# Altium footprint library PCB1.PcbLib: 98 footprints (part 1 of 7)
Each footprint in its own frame and in the unit in brackets; x right, y up, seen from the top. Pads: shape width x height; smd on the part's side, far side on the other; paste and mask are expansions set on the pad; w line width, h text height; cw(c..) or ccw(c..) is an arc to the next point about the centre after c.
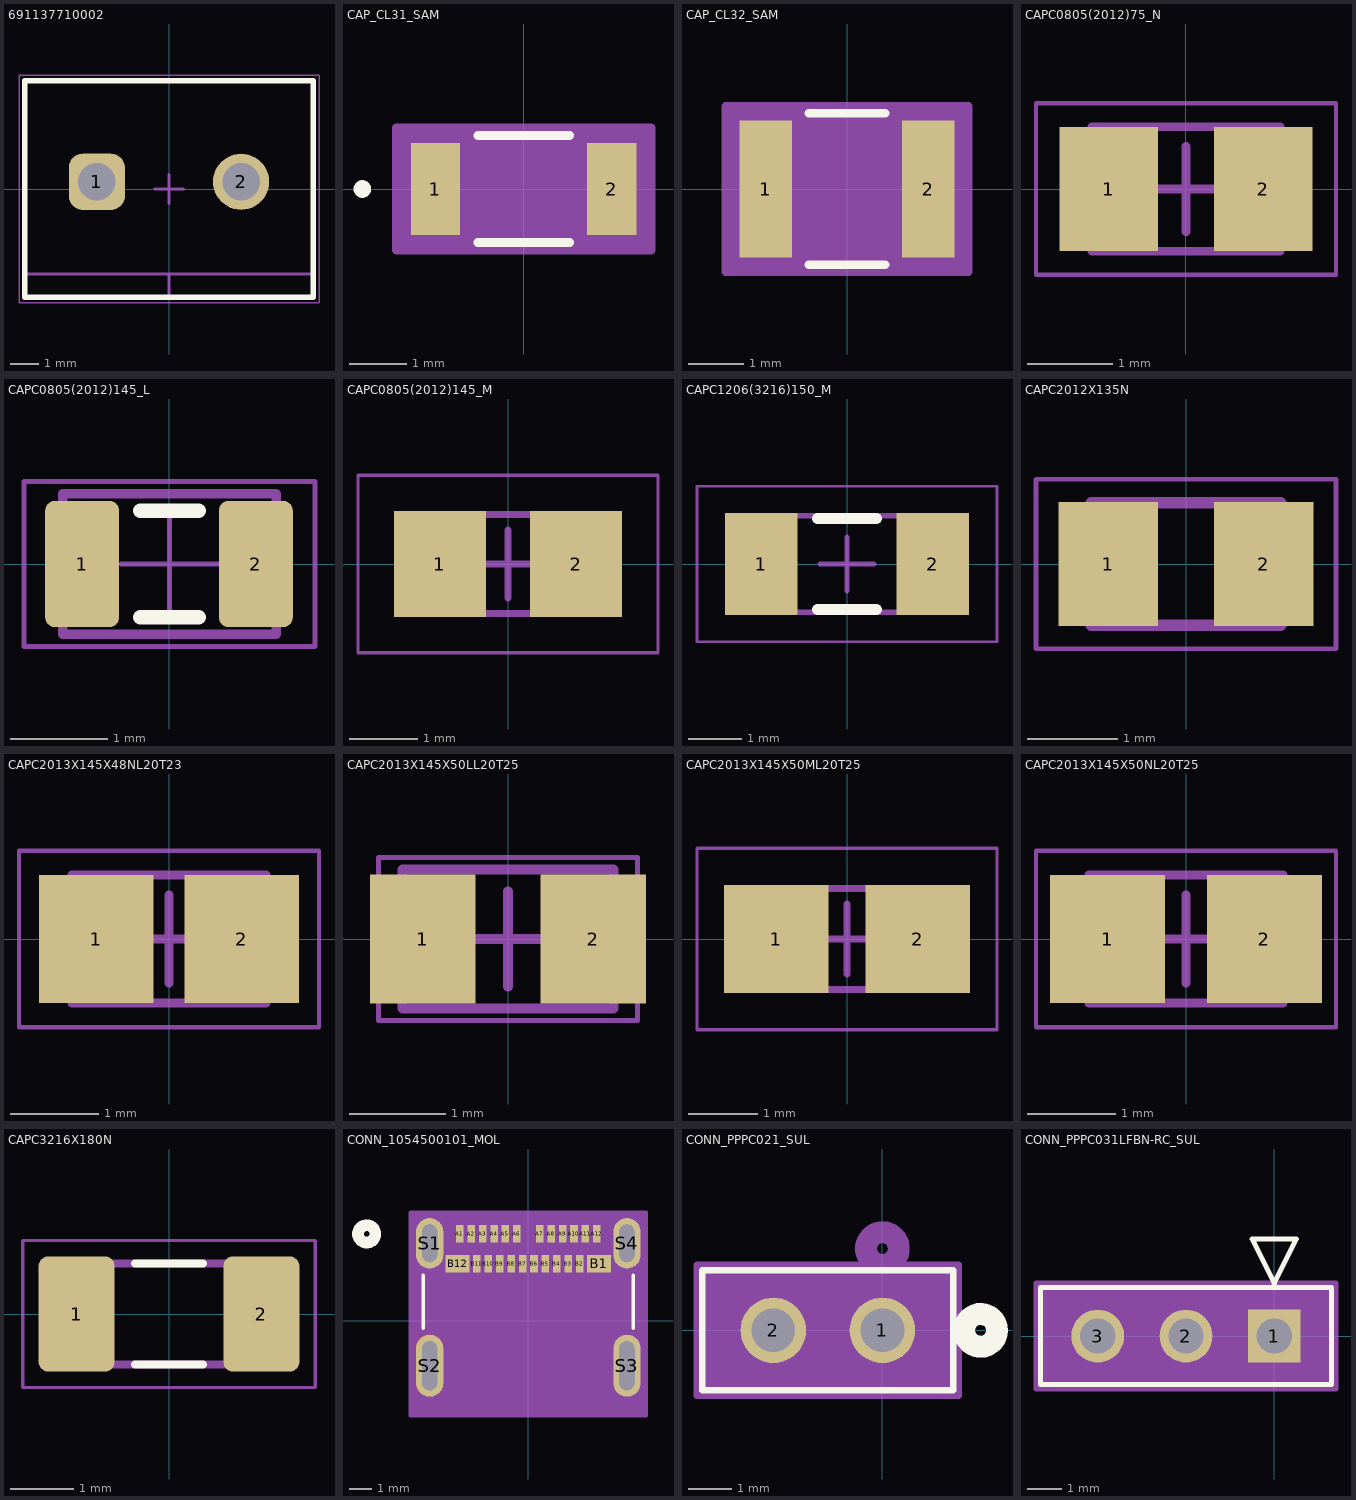
[diagram p0: the footprints below, top view; thin cyan lines are the x and y axes]

## 691137710002 [mm]
pads (2):
  rrect50% 1.95x1.95 hole 1.3: 1(-2.5,0.25)
  round 1.95 hole 1.3: 2(2.5,0.25)
Top Overlay:
  lines w0.2: -5,-3.75 -5,3.75 5,3.75 5,-3.75 -5,-3.75
Top Assembly:
  lines w0.1: -5,-2.95 5,-2.95 ; 0,-3.75 0,-2.95 ; -5,-3.75 5,-3.75 5,3.75 -5,3.75 -5,-3.75
Top Designator:
  text ".Designator" at -3.647,-0.357 h1
Top 3D Body:
  lines w0.1: -5,-2.95 5,-2.95 ; 0,-3.75 0,-2.95 ; -5,-3.75 -5,3.75 5,3.75 5,-3.75 -5,-3.75
Top Courtyard:
  lines w0.05: -5.2,-3.95 -5.2,3.95 5.2,3.95 5.2,-3.95 -5.2,-3.95
Top Component Center:
  lines w0.1: -0.5,0 0.5,0 ; 0,-0.5 0,0.5
3D body "691137710002.stp": height 11.6, standoff -3.5, extent -5,-3.75 5,3.75

## CAP_CL31_SAM [mm]
pads (2):
  rect 0.85x1.6 smd paste+0 mask+0: 1(-1.525,0) 2(1.525,0)
Top Overlay:
  circle w0.152: c-2.788,0 r0.076
  lines w0.152: -0.792,-0.927 0.792,-0.927 ; -0.792,0.927 0.792,0.927
Top 3D Body:
  circle w0: c-1.398,0 r0.076
  lines w0.025: -1.6,-0.8 -1.6,0.8 ; -1.6,-0.8 -1.1,-0.8 -1.1,0.8 -1.6,0.8 ; -1.6,-0.8 1.6,-0.8 ; -1.6,-0.8 -1.6,0.8 ; -1.6,0.8 1.6,0.8 ; 1.6,-0.8 1.1,-0.8 1.1,0.8 1.6,0.8 ; 1.6,-0.8 1.6,0.8 ; 1.6,-0.8 1.6,0.8
Top Courtyard:
  region: 2.204,-1.054 -2.204,-1.054 -2.204,1.054 2.204,1.054
  lines w0.152: -2.204,-1.054 -2.204,1.054 2.204,1.054 2.204,-1.054 -2.204,-1.054
3D body "CAP_CL31_SAM.step": height 1, standoff 0, extent -1.6,-0.8 1.6,0.8

## CAP_CL32_SAM [mm]
pads (2):
  rect 0.956x2.5 smd paste+0 mask+0: 1(-1.478,0) 2(1.478,0)
Top Overlay:
  lines w0.152: -0.692,-1.377 0.692,-1.377 ; -0.692,1.377 0.692,1.377
Top 3D Body:
  lines w0.025: -1.6,-1.25 -1.6,1.25 ; -1.6,-1.25 -1,-1.25 -1,1.25 -1.6,1.25 ; -1.6,-1.25 1.6,-1.25 ; -1.6,-1.25 -1.6,1.25 ; -1.6,1.25 1.6,1.25 ; 1.6,-1.25 1,-1.25 1,1.25 1.6,1.25 ; 1.6,-1.25 1.6,1.25 ; 1.6,-1.25 1.6,1.25
Top Courtyard:
  region: 2.21,-1.504 -2.21,-1.504 -2.21,1.504 2.21,1.504
  lines w0.152: -2.21,-1.504 -2.21,1.504 2.21,1.504 2.21,-1.504 -2.21,-1.504
3D body "CAP_CL32_SAM.step": height 1, standoff 0, extent -1.6,-1.25 1.6,1.25

## CAPC0805(2012)75_N [mm]
pads (2):
  rect 1.15x1.45 smd: 1(-0.9,0) 2(0.9,0)
Top 3D Body:
  lines w0.1: -1.1,-0.725 -1.1,0.725 1.1,0.725 1.1,-0.725 -1.1,-0.725
Top Courtyard:
  lines w0.05: -1.75,-1 -1.75,1 1.75,1 1.75,-1 -1.75,-1
  lines w0.1: -0.5,0 0.5,0 ; 0,-0.5 0,0.5
3D body: height 0.75, standoff 0, extent -0.6,-0.725 0.6,0.725
3D body: height 0.75, standoff 0, extent -1.1,-0.725 -0.6,0.725
3D body: height 0.75, standoff 0, extent 0.6,-0.725 1.1,0.725

## CAPC0805(2012)145_L [mm]
pads (2):
  rrect25% 0.76x1.3 smd: 1(-0.9,0) 2(0.89,0)
Top Overlay:
  lines w0.15: -0.3,-0.55 0.3,-0.55 ; -0.3,0.55 0.3,0.55
Top Assembly:
  lines w0.1: -1.1,-0.725 1.1,-0.725 1.1,0.725 -1.1,0.725 -1.1,-0.725
Top Courtyard:
  lines w0.05: -0.5,0 0.5,0 ; 0,-0.5 0,0.5 ; -1.5,-0.85 -1.5,0.85 1.5,0.85 1.5,-0.85 -1.5,-0.85
3D body "CAPC2012X145N EIA 0805.STEP": height 1.45, standoff 0, extent -1,-0.6 1,0.6

## CAPC0805(2012)145_M [mm]
pads (2):
  rect 1.35x1.55 smd: 1(-1,0) 2(1,0)
Top 3D Body:
  lines w0.1: -1.1,-0.725 -1.1,0.725 1.1,0.725 1.1,-0.725 -1.1,-0.725
Top Courtyard:
  lines w0.05: -2.2,-1.3 -2.2,1.3 2.2,1.3 2.2,-1.3 -2.2,-1.3
  lines w0.1: -0.5,0 0.5,0 ; 0,-0.5 0,0.5
3D body: height 1.45, standoff 0, extent -0.6,-0.725 0.6,0.725
3D body: height 1.45, standoff 0, extent -1.1,-0.725 -0.6,0.725
3D body: height 1.45, standoff 0, extent 0.6,-0.725 1.1,0.725

## CAPC1206(3216)150_M [mm]
pads (2):
  rect 1.35x1.9 smd: 1(-1.6,0) 2(1.6,0)
Top Overlay:
  lines w0.2: -0.55,-0.85 0.55,-0.85 ; -0.55,0.85 0.55,0.85
Top 3D Body:
  lines w0.1: -1.7,-0.9 -1.7,0.9 1.7,0.9 1.7,-0.9 -1.7,-0.9
Top Courtyard:
  lines w0.05: -2.8,-1.45 -2.8,1.45 2.8,1.45 2.8,-1.45 -2.8,-1.45
  lines w0.1: -0.5,0 0.5,0 ; 0,-0.5 0,0.5
3D body: height 1.5, standoff 0, extent -1.2,-0.9 1.2,0.9
3D body: height 1.5, standoff 0, extent -1.7,-0.9 -1.2,0.9
3D body: height 1.5, standoff 0, extent 1.2,-0.9 1.7,0.9

## CAPC2012X135N [mm]
pads (2):
  rect 1.1x1.38 smd paste+0 mask+0.102: 1(-0.863,0) 2(0.863,0)
Top 3D Body:
  lines w0.127: -1.05,-0.68 -1.05,0.68 1.05,0.68 1.05,-0.68 -1.05,-0.68
Top Courtyard:
  lines w0.05: -1.665,-0.94 -1.665,0.94 1.665,0.94 1.665,-0.94 -1.665,-0.94
3D body "step_temp.STEP": height 1.35, standoff 0, extent -1,-0.625 1,0.625

## CAPC2013X145X48NL20T23 [mm]
pads (2):
  rect 1.3x1.45 smd: 1(-0.825,0) 2(0.825,0)
Top 3D Body:
  lines w0.1: -1.1,-0.725 1.1,-0.725 1.1,0.725 -1.1,0.725 -1.1,-0.725
Top Courtyard:
  lines w0.05: -1.7,-1 1.7,-1 1.7,1 -1.7,1 -1.7,-1
  lines w0.1: -0.5,0 0.5,0 ; 0,-0.5 0,0.5
3D body: height 1.45, standoff 0, extent 0.62,-0.725 1.1,0.725
3D body: height 1.45, standoff 0, extent -1.1,-0.725 -0.62,0.725
3D body: height 1.45, standoff 0, extent -0.62,-0.725 0.62,0.725

## CAPC2013X145X50LL20T25 [mm]
pads (2):
  rect 1.1x1.35 smd: 1(-0.889,0) 2(0.889,0)
Top 3D Body:
  lines w0.1: -1.1,-0.725 -1.1,0.725 1.1,0.725 1.1,-0.725 -1.1,-0.725
Top Courtyard:
  lines w0.05: -1.35,-0.85 -1.35,0.85 1.35,0.85 1.35,-0.85 -1.35,-0.85
  lines w0.1: -0.5,0 0.5,0 ; 0,-0.5 0,0.5
3D body: height 1.45, standoff 0, extent -0.6,-0.725 0.6,0.725
3D body: height 1.45, standoff 0, extent -1.1,-0.725 -0.6,0.725
3D body: height 1.45, standoff 0, extent 0.6,-0.725 1.1,0.725

## CAPC2013X145X50ML20T25 [mm]
pads (2):
  rect 1.5x1.55 smd: 1(-1.016,0) 2(1.016,0)
Top 3D Body:
  lines w0.1: -1.1,-0.725 1.1,-0.725 1.1,0.725 -1.1,0.725 -1.1,-0.725
Top Courtyard:
  lines w0.05: -2.15,-1.3 2.15,-1.3 2.15,1.3 -2.15,1.3 -2.15,-1.3
  lines w0.1: -0.5,0 0.5,0 ; 0,-0.5 0,0.5
3D body "CAPC2012X14L.step": height 1.45, standoff 0, extent -1.1,-0.725 1.1,0.725

## CAPC2013X145X50NL20T25 [mm]
pads (2):
  rect 1.3x1.45 smd: 1(-0.889,0) 2(0.889,0)
Top 3D Body:
  lines w0.1: -1.1,-0.725 1.1,-0.725 1.1,0.725 -1.1,0.725 -1.1,-0.725
Top Courtyard:
  lines w0.05: -1.7,-1 1.7,-1 1.7,1 -1.7,1 -1.7,-1
  lines w0.1: -0.5,0 0.5,0 ; 0,-0.5 0,0.5
3D body: height 1.45, standoff 0, extent 0.6,-0.725 1.1,0.725
3D body: height 1.45, standoff 0, extent -1.1,-0.725 -0.6,0.725
3D body: height 1.45, standoff 0, extent -0.6,-0.725 0.6,0.725

## CAPC3216X180N [mm]
pads (2):
  rrect25% 1.2x1.82 smd: 1(-1.46,0) 2(1.46,0)
Top Overlay:
  lines w0.127: -0.54,-0.8 0.54,-0.8 ; -0.54,0.8 0.54,0.8
Top 3D Body:
  lines w0.127: -1.6,-0.8 1.6,-0.8 1.6,0.8 -1.6,0.8 -1.6,-0.8
Top Courtyard:
  lines w0.05: -2.31,-1.16 2.31,-1.16 2.31,1.16 -2.31,1.16 -2.31,-1.16
3D body "step_temp.STEP": height 1.8, standoff 0, extent -1.6,-0.8 1.6,0.8

## CONN_1054500101_MOL [mil]
pads (28):
  rect 13x30 smd paste+0 mask+0: A1(-118.11,149.96) A2(-98.43,149.96) A3(-78.74,149.96) A4(-59.06,149.96) A5(-39.37,149.96) A6(-19.68,149.96) A7(19.68,149.96) A8(39.37,149.96) A9(59.06,149.96) A10(78.74,149.96) A11(98.43,149.96) A12(118.11,149.96) B2(88.58,98.78) B3(68.9,98.78) B4(49.21,98.78) B5(29.53,98.78) B6(9.84,98.78) B7(-9.84,98.78) B8(-29.53,98.78) B9(-49.21,98.78) B10(-68.9,98.78) B11(-88.58,98.78)
  rect 41x30 smd paste+0 mask+0: B1(122.05,98.78) B12(-122.05,98.78)
  oval 47x87 hole 26 slot 65 at 90 deg paste-99999 mask-43.5: S1(-170.08,133.81) S4(170.08,133.81)
  oval 47x107 hole 26 slot 85 at 90 deg paste-99999 mask-53.5: S2(-170.08,-77.21) S3(170.08,-77.21)
Top Layer:
  region: -193.13,-42.62 -193.58,-47.21 -193.58,-107.21 -193.13,-111.79 -191.79,-116.2 -189.62,-120.26 -186.7,-123.83 -183.13,-126.75 -179.07,-128.92 -174.66,-130.26 -170.08,-130.71 -165.49,-130.26 -161.09,-128.92 -157.02,-126.75 -153.46,-123.83 -150.54,-120.26 -148.37,-116.2 -147.03,-111.79 -146.58,-107.21 -146.58,-47.21 -147.03,-42.62 -148.37,-38.22 -150.54,-34.15 -153.46,-30.59 -157.02,-27.67 -161.09,-25.5 -165.49,-24.16 -170.08,-23.71 -174.66,-24.16 -179.07,-25.5 -183.13,-27.67 -186.7,-30.59 -189.62,-34.15 -191.79,-38.22
Top Overlay:
  circle w20: c-278.58,149.96 r15
  lines w6: -181,-12.78 -181,78.88 ; 181,-12.78 181,78.88
Bottom Overlay:
  circle w20: c-278.58,149.96 r15
Top 3D Body:
  circle w20: c-118.11,149.96 r15
  lines w1: -176,-153.5 -176,153.5 176,153.5 176,-153.5 -176,-153.5
Top Courtyard:
  region: 203.58,187.31 -203.58,187.31 -203.58,-163.5 203.58,-163.5
  lines w6: -203.58,-163.5 203.58,-163.5 203.58,187.31 -203.58,187.31 -203.58,-163.5
Multi-Layer:
  lines w1: -203.58,-146.67 203.58,-146.67
3D body "1054500101.stp": height 125.2, standoff -30.7, extent -175.98,-145.04 175.98,165.98

## CONN_PPPC021_SUL [mil]
pads (2):
  round 60 hole 40 paste-99999 mask+0: 1(0,0) 2(-100,0)
Top Overlay:
  circle w20: c90,0 r15
  lines w6: -165,-55 65,-55 65,55 -165,55 -165,-55
Bottom Overlay:
  circle w20: c90,0 r15
Top 3D Body:
  circle w20: c0,75 r15
  lines w1: -160,-50 -160,50 60,50 60,-50 -160,-50
Top Courtyard:
  region: 70,60 -170,60 -170,-60 70,-60
  lines w6: -170,-60 70,-60 70,60 -170,60 -170,-60
3D body "PPPC021LFBN-RC.STEP": height 337, standoff -124, extent -160,-50 60,50

## CONN_PPPC031LFBN-RC_SUL [mil]
pads (3):
  rect 60x60 / inner round 60 / far side rect 60x60 hole 40 paste-99999 mask+0: 1(0,0)
  round 60 hole 40 paste-99999 mask+0: 2(-100,0) 3(-200,0)
Top Overlay:
  lines w6: -265,-55 -265,55 65,55 65,-55 -265,-55 ; -25,110 0,60 25,110 -25,110
Top 3D Body:
  lines w1: -260,-50 60,-50 60,50 -260,50 -260,-50 ; -25,110 0,60 25,110 -25,110
Top Courtyard:
  region: 70,60 -270,60 -270,-60 70,-60
  lines w6: -270,-60 -270,60 70,60 70,-60 -270,-60
3D body "PPPC031LFBN-RC.STEP": height 335, standoff -126, extent -260,-50 60,50